# Altium footprint library Connectors.PcbLib: 92 footprints (part 6 of 6)
Each footprint in its own frame and in the unit in brackets; x right, y up, seen from the top. Pads: shape width x height; smd on the part's side, far side on the other; paste and mask are expansions set on the pad; w line width, h text height; cw(c..) or ccw(c..) is an arc to the next point about the centre after c.
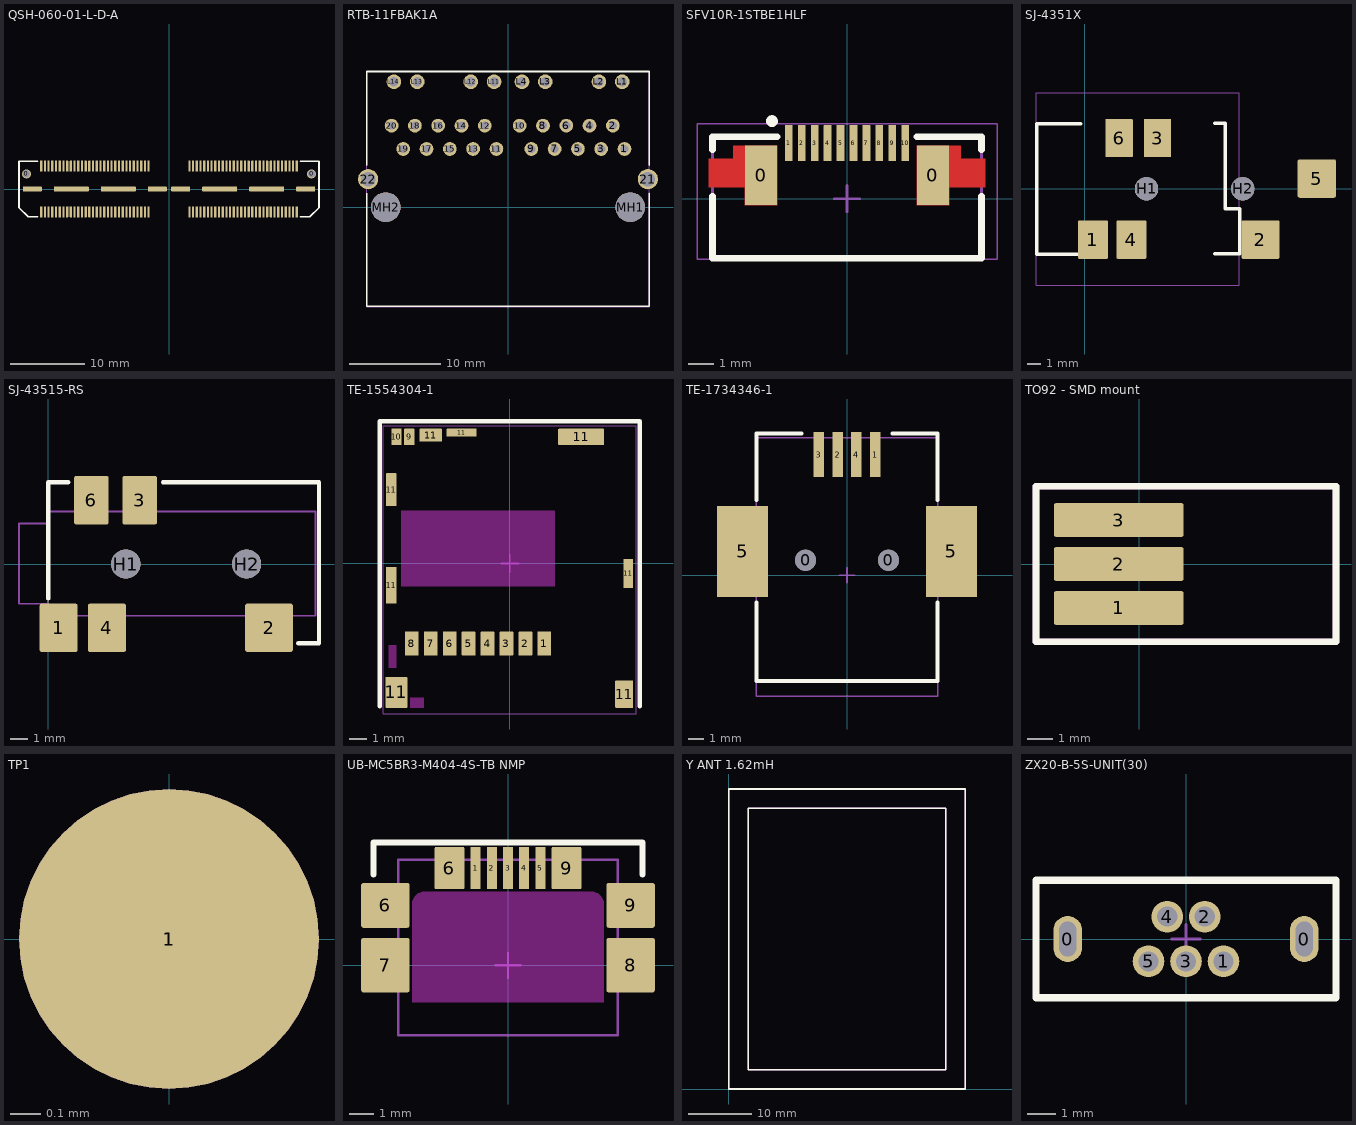
[diagram p5: the footprints below, top view; thin cyan lines are the x and y axes]

## QSH-060-01-L-D-A [mil]
height 160
pads (130):
  round 47.24 hole 40: 0(-757.5,80) 0(757.5,80)
  rrect20% 12x57 smd: 1(-679.18,122) 2(-679.18,-122) 3(-659.5,122) 4(-659.5,-122) 5(-639.81,122) 6(-639.81,-122) 7(-620.13,122) 8(-620.13,-122) 9(-600.44,122) 10(-600.44,-122) 11(-580.76,122) 12(-580.76,-122) 13(-561.07,122) 14(-561.07,-122) 15(-541.39,122) 16(-541.39,-122) 17(-521.7,122) 18(-521.7,-122) 19(-502.02,122) 20(-502.02,-122) 21(-482.33,122) 22(-482.33,-122) 23(-462.65,122) 24(-462.65,-122) 25(-442.96,122) 26(-442.96,-122) 27(-423.28,122) 28(-423.28,-122) 29(-403.59,122) 30(-403.59,-122) 31(-383.91,122) 32(-383.91,-122) 33(-364.22,122) 34(-364.22,-122) 35(-344.54,122) 36(-344.54,-122) 37(-324.85,122) 38(-324.85,-122) 39(-305.17,122) 40(-305.17,-122) 41(-285.48,122) 42(-285.48,-122) 43(-265.8,122) 44(-265.8,-122) 45(-246.11,122) 46(-246.11,-122) 47(-226.43,122) 48(-226.43,-122) 49(-206.74,122) 50(-206.74,-122) 51(-187.06,122) 52(-187.06,-122) 53(-167.37,122) 54(-167.37,-122) 55(-147.69,122) 56(-147.69,-122) 57(-128,122) 58(-128,-122) 59(-108.32,122) 60(-108.32,-122) 61(108.32,122) 62(108.32,-122) 63(128,122) 64(128,-122) 65(147.69,122) 66(147.69,-122) 67(167.37,122) 68(167.37,-122) 69(187.06,122) 70(187.06,-122) 71(206.74,122) 72(206.74,-122) 73(226.43,122) 74(226.43,-122) 75(246.11,122) 76(246.11,-122) 77(265.8,122) 78(265.8,-122) 79(285.48,122) 80(285.48,-122) 81(305.17,122) 82(305.17,-122) 83(324.85,122) 84(324.85,-122) 85(344.54,122) 86(344.54,-122) 87(364.22,122) 88(364.22,-122) 89(383.91,122) 90(383.91,-122) 91(403.59,122) 92(403.59,-122) 93(423.28,122) 94(423.28,-122) 95(442.96,122) 96(442.96,-122) 97(462.65,122) 98(462.65,-122) 99(482.33,122) 100(482.33,-122) 101(502.02,122) 102(502.02,-122) 103(521.7,122) 104(521.7,-122) 105(541.39,122) 106(541.39,-122) 107(561.07,122) 108(561.07,-122) 109(580.76,122) 110(580.76,-122) 111(600.44,122) 112(600.44,-122) 113(620.13,122) 114(620.13,-122) 115(639.81,122) 116(639.81,-122) 117(659.5,122) 118(659.5,-122) 119(679.18,122) 120(679.18,-122)
  rrect20% 100x25 smd: SH1(-726.25,0.02) SH2(-61.25,0.02) SH5(61.25,0.02) SH8(726.25,0.02)
  rrect20% 185x25 smd: SH3(-518.75,0.02) SH4(-268.75,0.02) SH6(268.75,0.02) SH7(518.75,0.02)
Top Overlay:
  lines w10: -698.82,-147.64 -748.03,-147.64 -797.24,-98.43 -797.24,147.64 -698.82,147.64 ; 698.82,-147.64 748.03,-147.64 797.24,-98.43 797.24,147.64 698.82,147.64
Mechanical 13:
  text ".Comment" at -393.7,167.32 h20
  text ".Designator" at -777.56,167.32 h20
3D body "Samtec-QTH-060-01-L-D-A.STEP": height 170.01, standoff -27, extent -787.5,-140 787.5,140

## RTB-11FBAK1A [mm] "MagJack 2x1 10/100/1000"
height 13.45
pads (32):
  round 1.5 hole 0.89: 1(12.705,6.35) 2(11.435,8.89) 3(10.165,6.35) 4(8.895,8.89) 5(7.625,6.35) 6(6.355,8.89) 7(5.085,6.35) 8(3.815,8.89) 9(2.545,6.35) 10(1.275,8.89) 11(-1.265,6.35) 12(-2.535,8.89) 13(-3.805,6.35) 14(-5.075,8.89) 15(-6.345,6.35) 16(-7.615,8.89) 17(-8.885,6.35) 18(-10.155,8.89) 19(-11.425,6.35) 20(-12.695,8.89)
  round 2.2 hole 1.6: 21(15.26,3.05) 22(-15.26,3.05)
  round 1.6 hole 1.03: L1(12.455,13.68) L2(9.915,13.68) L3(4.065,13.68) L4(1.525,13.68) L11(-1.515,13.68) L12(-4.055,13.68) L13(-9.905,13.68) L14(-12.445,13.68)
  round 3.25 hole 3.25 unplated mask-2: MH1(13.335,0) MH2(-13.335,0)
Top Overlay:
  lines w0.2: -15.4,1.5 -15.4,-10.8 15.4,-10.8 15.4,1.5 ; -15.4,4.6 -15.4,14.8 15.4,14.8 15.4,4.6
Mechanical 13:
  lines w0.1: -15.385,-10.86 15.385,-10.86 15.385,14.82 -15.385,14.82 -15.385,-10.86
  text ".Comment" at -2.61,-2.6 h0.51
  text ".Designator" at -2.635,-1.9 h0.51
3D body "RTB-1XFB-10PIN-1.step": height 15.72, standoff -3.05, extent -17.268,-11.103 17.3,14.903

## SFV10R-1STBE1HLF [mm] "FPC 10pin 0.5mm right angle, bottom contacts"
height 1.8
pads (12):
  rect 1.25x2.3 smd: 0(-3.325,0.9) 0(3.325,0.9)
  rrect10% 0.3x1.4 smd: 1(-2.25,2.15) 2(-1.75,2.15) 3(-1.25,2.15) 4(-0.75,2.15) 5(-0.25,2.15) 6(0.25,2.15) 7(0.75,2.15) 8(1.25,2.15) 9(1.75,2.15) 10(2.25,2.15)
Top Layer:
  region: -2.7,-0.25 -2.7,2.05 -4.4,2.05 -4.4,1.55 -5.35,1.55 -5.35,0.45 -3.95,0.45 -3.95,-0.25
  region: 2.7,-0.25 2.7,2.05 4.4,2.05 4.4,1.55 5.35,1.55 5.35,0.45 3.95,0.45 3.95,-0.25
Top Overlay:
  circle w0.254: c-2.9,3 r0.1
  lines w0.254: -5.2,-2.3 -5.2,0.1 ; -5.2,-2.3 0,-2.3 5.2,-2.3 5.2,0.1 ; -5.2,1.9 -5.2,2.4 -2.7,2.4 ; 2.7,2.4 5.2,2.4 5.2,1.9
Mechanical 13:
  lines w0.1: -2.7,2.4 -5.2,2.4 -5.2,-2.3 0,-2.3 5.2,-2.3 5.2,2.4 2.7,2.4
  text ".Designator" at -2.25,-0.85 h0.51
  text ".Comment" at -2.225,-1.55 h0.51
Mechanical 15:
  lines w0.05: -5.8,-2.35 5.8,-2.35 5.8,2.9 -5.8,2.9 -5.8,-2.35
  lines w0.1: -0.5,0 0.5,0 ; 0,-0.5 0,0.5
3D body "sfv10r1ste1hlf-1.stp": height 1.87, standoff 0, extent -5.25,-2.35 5.25,2.55

## SJ-4351X [mm] "3.5mm SMT connector"
height 5
pads (8):
  rrect10% 2.2x2.8 smd: 1(0.6,-3.7) 4(3.4,-3.7)
  rrect10% 2.8x2.8 smd: 2(12.8,-3.7) 5(16.9,0.75)
  rrect10% 2x2.8 smd: 3(5.3,3.7) 6(2.5,3.7)
  round 1.7 hole 1.7 unplated: H1(4.5,0) H2(11.5,0)
Top Overlay:
  lines w0.254: -0.3,-4.75 -3.5,-4.75 -3.5,4.75 -0.3,4.75 ; 9.475,-4.725 11.275,-4.725 11.275,-1.45 10.225,-1.45 10.225,4.775 9.475,4.775
Mechanical 13:
  lines w0.1: -0.3,-4.75 -3.5,-4.75 -3.5,4.75 -0.3,4.75 ; 9.45,-4.75 11.25,-4.75 11.25,-1.475 10.2,-1.475 10.2,4.75 9.45,4.75
  text ".Designator" at 2.6,7.9 h0.51
  text ".Comment" at 2.625,7.2 h0.51
Mechanical 15:
  lines w0.05: -3.55,-7.025 11.25,-7.025 11.25,7 -3.55,7 -3.55,-7.025
  lines w0.1: 4,0 5,0 ; 4.5,-0.5 4.5,0.5

## SJ-43515-RS [mm] "3.5mm SMT connector - Ring contact"
height 5
pads (7):
  rrect10% 2.2x2.8 smd: 1(0.6,-3.7) 4(3.4,-3.7)
  rrect10% 2.8x2.8 smd: 2(12.8,-3.7)
  rrect10% 2x2.8 smd: 3(5.3,3.7) 6(2.5,3.7)
  round 1.7 hole 1.7 unplated: H1(4.5,0) H2(11.5,0)
Top Overlay:
  lines w0.254: 0,-2 0,4.75 1.15,4.75 ; 6.65,4.75 15.7,4.75 15.7,-1.45 15.7,-4.6 14.5,-4.6
Mechanical 13:
  lines w0.1: -1.7,-2.3 0,-2.3 0,-3 15.5,-3 15.5,3.05 0,3.05 0,2.35 -1.7,2.35 -1.7,-2.3
  text ".Comment" at 7.275,1.3 h0.51
  text ".Designator" at 7.25,2 h0.51
Mechanical 15:
  lines w0.05: 0,-3 0,3.05 15.5,3.05 15.5,-3 0,-3
  lines w0.1: 4,0 5,0 ; 4.5,-0.5 4.5,0.5
3D body "SJ-43515RS-SMT-a.stp": height 5.1, standoff -0.7, extent -1.7,-4.425 15.5,4.575

## TE-1554304-1 [mm] "uSD socket, push in, push out, SMT"
height 1.43
pads (18):
  rrect10% 0.8x1.4 smd: 1(2.003,-4.66) 2(0.903,-4.66) 3(-0.198,-4.66) 4(-1.298,-4.66) 5(-2.398,-4.66) 6(-3.497,-4.66) 7(-4.597,-4.66) 8(-5.697,-4.66)
  rrect10% 0.6x0.95 smd: 9(-5.847,7.35) 10(-6.588,7.35)
  rrect10% 0.6x2.13 smd: 11(-6.887,-1.275)
  rrect10% 0.6x1.91 smd: 11(-6.887,4.285)
  rrect10% 1.3x1.8 smd: 11(-6.588,-7.5)
  rrect10% 1.3x0.75 smd: 11(-4.597,7.45)
  rrect10% 1.74x0.45 smd: 11(-2.808,7.6)
  rrect10% 2.66x0.95 smd: 11(4.137,7.35)
  rrect10% 1.04x1.6 smd: 11(6.643,-7.6)
  rrect10% 0.55x1.7 smd: 11(6.887,-0.58)
Top Layer keep-out:
  region: -5.797,-7.8 -5.007,-7.8 -5.007,-8.4 -5.797,-8.4
  region: -7.037,-4.75 -6.588,-4.75 -6.588,-6.05 -7.037,-6.05
  region: -6.298,3.07 2.603,3.07 2.603,-1.34 -6.298,-1.34
Top Overlay:
  lines w0.254: -7.55,-8.3 -7.55,8.25 7.55,8.25 7.55,-8.3
Mechanical 13:
  text ".Designator" at -4.892,-2.735 h0.51
  text ".Comment" at -4.867,-3.435 h0.51
Mechanical 15:
  lines w0.05: -7.35,-8.75 7.35,-8.75 7.35,8 -7.35,8 -7.35,-8.75
  lines w0.1: -0.5,0 0.5,0 ; 0,-0.5 0,0.5
3D body "c-1554304-1-e-3d-1.stp": height 1.46, standoff 0, extent -6.973,-8.71 6.878,7.59

## TE-1734346-1 [mm] "USB TypeB 2.0 4 Position Surface Mount, Right Angle, Horizontal"
height 11
pads (8):
  round 1.4 hole 1.4 unplated: 0(-2.75,1) 0(2.75,1)
  rect 0.7x3 smd: 1(1.87,8) 2(-0.62,8) 3(-1.87,8) 4(0.62,8)
  rect 3.4x6.04 smd: 5(-6.92,1.58) 5(6.92,1.58)
Top Overlay:
  lines w0.254: -6,-1.8 -6,-7 6,-7 6,-1.8 ; -6,5 -6,9.4 -3,9.4 ; 3,9.4 6,9.4 6,5
Mechanical 13:
  lines w0.1: -6,-8 -6,9.1 6,9.1 6,-8 -6,-8
  text ".Designator" at -2.425,-0.3 h0.51
  text ".Comment" at -2.4,-1 h0.51
Mechanical 15:
  lines w0.1: -0.5,0 0.5,0 ; 0,-0.5 0,0.5 ; -6,-8 6,-8 6,9.1 -6,9.1 -6,-8
3D body "c-1-1734346-1-c-3d.stp": height 11.3, standoff -1.12, extent -8.25,-8 8.25,9.1

## TO92 - SMD mount [mm] "TO92 - SMD mount"
pads (3):
  rrect10% 5x1.3 smd: 1(-0.8,-1.7) 2(-0.8,0) 3(-0.8,1.7)
Top Overlay:
  lines w0.254: -4,-3 7.6,-3 7.6,3 -4,3 -4,-3
Mechanical 13:
  lines w0.254: -4,-3 -4,3 7.6,3 7.6,-3 -4,-3
  text ".Comment" at -2.17,3.325 h0.51
  text ".Designator" at -2.195,4.025 h0.51
Mechanical 15:
  lines w0.05: -4,-3 -4,3 7.6,3 7.6,-3 -4,-3
  lines w0.1: -0.5,0 0.5,0 ; 0,-0.5 0,0.5
3D body "TO-92-6.STEP": height 4, standoff 0, extent -3,-2.499 7,2.499

## TP1 [mm]
pads (2):
  round 1 smd paste-0.5: 1(0,0)
  round 1 on Mech2 paste-0.5: 1(0,0)
Mechanical 28:
  text ".Designator" at -0.5,0.7 h0.51
3D body: height 0, standoff 0, extent -0.351,-0.353 0.354,0.353

## UB-MC5BR3-M404-4S-TB NMP [mm] "MicroUSB B SMT midmount"
height 0.85
pads (11):
  rrect10% 0.4x1.7 smd: 1(-1.3,3.9) 2(-0.65,3.9) 3(0,3.9) 4(0.65,3.9) 5(1.3,3.9)
  rrect10% 1.95x1.8 smd: 6(-4.925,2.4) 9(4.925,2.4)
  rrect10% 1.2x1.7 smd: 6(-2.35,3.9) 9(2.35,3.9)
  rrect10% 1.95x2.2 smd: 7(-4.925,0) 8(4.925,0)
Top Overlay:
  lines w0.254: -5.4,3.65 -5.4,4.925 0,4.925 5.4,4.925 5.4,3.65
Keep-Out Layer:
  board cut-out: 3.85,-1.5 3.85,2.45 3.85,2.549 3.774,2.733 3.633,2.874 3.449,2.95 3.35,2.95 -3.35,2.95 -3.449,2.95 -3.633,2.874 -3.774,2.733 -3.85,2.549 -3.85,2.45 -3.85,-1.5
Mechanical 13:
  lines w0.1: -4.4,-2.825 -4.4,4.225 4.4,4.225 4.4,-2.825 -4.4,-2.825
  text ".Comment" at -4.5,4.975 h0.51
  text ".Designator" at -4.5,5.65 h0.51
Mechanical 15:
  lines w0.1: -0.5,0 0.5,0 ; 0,-0.5 0,0.5
3D body "UB-MC5ABR3-M04-4S_NMP-color.step": height 1.12, standoff -1.88, extent -5.4,-2.825 5.4,4.225

## Y ANT 1.62mH [mm]
height 3
Top Overlay:
  lines w0.254: 0,0 0,47 37,47 37,0 0,0 ; 3,3 3,44 34,44 34,3 3,3
Mechanical 13:
  lines w0.254: 0,0 37,0 37,47 0,47 0,0 ; 3,3 34,3 34,44 3,44 3,3
  text ".Comment" at 12,1 h0.51
  text ".Designator" at 4,1 h0.51
3D body "Y ANT 1.62mH-v4.step": height 3, standoff 0, extent 0,0 37,47

## ZX20-B-5S-UNIT(30) [mm] "microUSB B 2.0 connector Male, ThruHole"
height 13.2
pads (7):
  rrect100% 1x1.6 hole 0.6 slot 1.2 at 90 deg: 0(-4.1,0) 0(4.1,0)
  round 1.1 hole 0.7: 1(1.3,-0.775) 2(0.65,0.775) 3(0,-0.775) 4(-0.65,0.775) 5(-1.3,-0.775)
Top Overlay:
  lines w0.254: -5.2,-2.032 0,-2.032 5.2,-2.032 5.2,0 5.2,2.032 0,2.032 -5.2,2.032 -5.2,0 -5.2,-2.032
Mechanical 13:
  lines w0.1: -5.2,-2.032 5.2,-2.032 5.2,2.032 -5.2,2.032 -5.2,-2.032
  text ".Comment" at 1.4,2.3 h0.51
  text ".Designator" at -4.9,2.3 h0.51
Mechanical 15:
  lines w0.1: -0.5,0 0.5,0 ; 0,-0.5 0,0.5 ; -5.2,-2.032 -5.2,2.032 5.2,2.032 5.2,-2.032 -5.2,-2.032
3D body "ZX20-B-5S.step": height 12.2, standoff -1.4, extent -4.2,-2.25 4.2,2.15